# Altium footprint library ECU_AutoRC_r00.PcbLib: 62 footprints (part 3 of 4)
Each footprint in its own frame and in the unit in brackets; x right, y up, seen from the top. Pads: shape width x height; smd on the part's side, far side on the other; paste and mask are expansions set on the pad; w line width, h text height; cw(c..) or ccw(c..) is an arc to the next point about the centre after c.
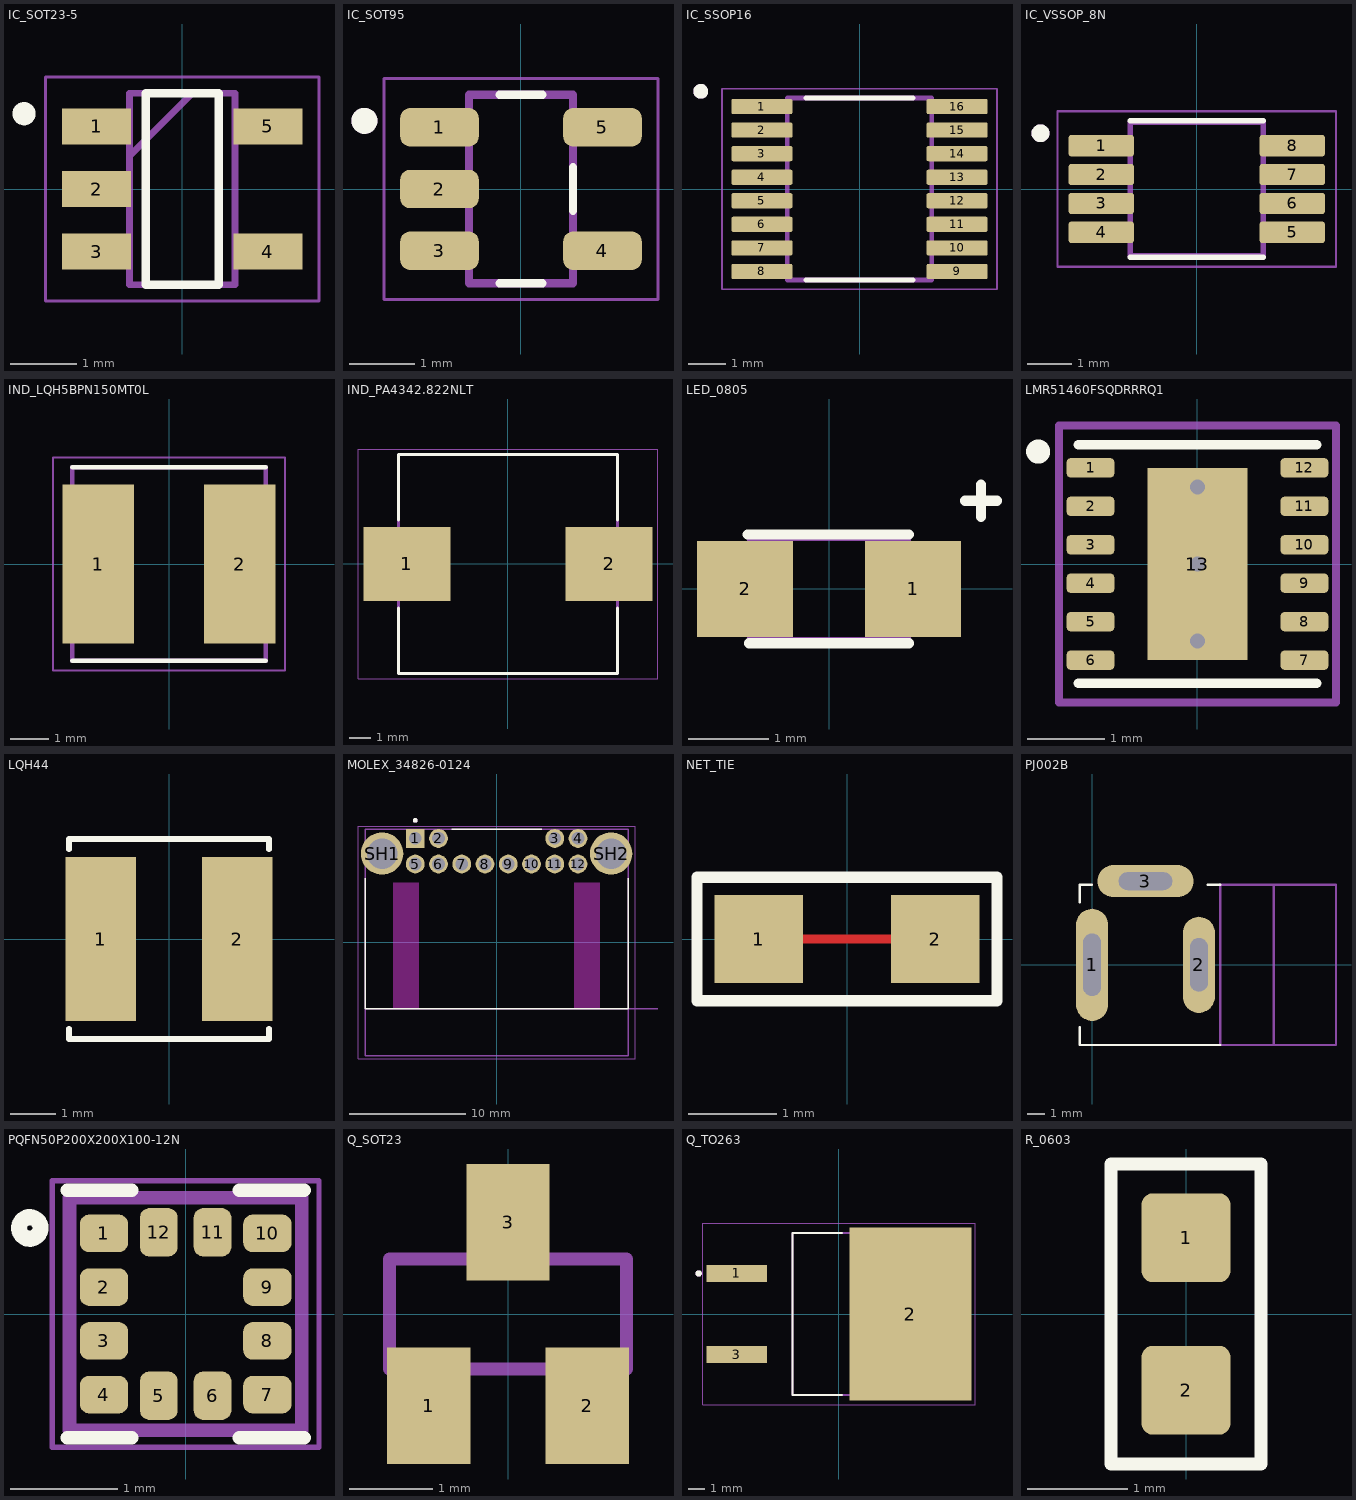
[diagram p2: the footprints below, top view; thin cyan lines are the x and y axes]

## IC_SOT23-5 [mm]
pads (5):
  rect 1.05x0.55 smd: 1(-1.3,0.95) 2(-1.3,0) 3(-1.3,-0.95) 4(1.3,-0.95) 5(1.3,0.95)
Top Overlay:
  circle w0.2: c-2.4,1.143 r0.076
  lines w0.127: -0.552,-1.45 0.552,-1.45 0.552,1.45 -0.552,1.45 -0.552,-1.45
Mechanical 13:
  lines w0.1: -0.8,0.5 0.15,1.45 ; -0.8,-1.45 0.8,-1.45 0.8,1.45 -0.8,1.45 -0.8,-1.45
Mechanical 15:
  lines w0.05: -2.075,-1.7 2.075,-1.7 2.075,1.7 -2.075,1.7 -2.075,-1.7
3D body "step_temp.STEP": height 1, standoff 0, extent -1.4,-1.45 1.4,1.45

## IC_SOT95 [mm]
pads (5):
  rrect50% 1.21x0.59 smd: 1(-1.255,0.95) 2(-1.255,0) 3(-1.255,-0.95) 4(1.255,-0.95) 5(1.255,0.95)
Top Overlay:
  circle w0.2: c-2.41,1.05 r0.1
  lines w0.127: -0.33,-1.45 0.33,-1.45 ; -0.33,1.45 0.33,1.45 ; 0.8,-0.335 0.8,0.335
Mechanical 13:
  circle w0.2: c-2.41,1.05 r0.1
  lines w0.127: -0.8,-1.45 0.8,-1.45 0.8,1.45 -0.8,1.45 -0.8,-1.45
Mechanical 15:
  lines w0.05: -2.11,-1.7 -2.11,1.7 2.11,1.7 2.11,-1.7 -2.11,-1.7
3D body "TPS72101DBVR.STEP": height 1.45, standoff 0, extent -1.4,-1.45 1.4,1.45

## IC_SSOP16 [mm]
pads (16):
  rrect25% 1.65x0.41 smd: 1(-2.63,2.222) 2(-2.63,1.587) 3(-2.63,0.953) 4(-2.63,0.318) 5(-2.63,-0.318) 6(-2.63,-0.953) 7(-2.63,-1.587) 8(-2.63,-2.222) 9(2.63,-2.222) 10(2.63,-1.587) 11(2.63,-0.953) 12(2.63,-0.318) 13(2.63,0.318) 14(2.63,0.953) 15(2.63,1.587) 16(2.63,2.222)
Top Overlay:
  circle w0.2: c-4.28,2.632 r0.1
  lines w0.127: -1.45,-2.452 1.45,-2.452 ; -1.45,2.452 1.45,2.452
Mechanical 13:
  circle w0.2: c-4.28,2.632 r0.1
  lines w0.127: -1.947,-2.452 1.947,-2.452 1.947,2.452 -1.947,2.452 -1.947,-2.452
Mechanical 15:
  lines w0.05: -3.705,-2.702 3.705,-2.702 3.705,2.702 -3.705,2.702 -3.705,-2.702
3D body "step_temp.STEP": height 1.75, standoff 0, extent -2.997,-2.451 2.997,2.451

## IC_VSSOP_8N [mm]
pads (8):
  rrect25% 1.47x0.48 smd: 1(-2.15,0.975) 2(-2.15,0.325) 3(-2.15,-0.325) 4(-2.15,-0.975) 5(2.15,-0.975) 6(2.15,-0.325) 7(2.15,0.325) 8(2.15,0.975)
Top Overlay:
  circle w0.2: c-3.52,1.255 r0.1
  lines w0.127: -1.5,-1.535 1.5,-1.535 ; -1.5,1.535 1.5,1.535
Mechanical 13:
  circle w0.2: c-3.52,1.255 r0.1
  lines w0.127: -1.5,-1.5 -1.5,1.5 1.5,1.5 1.5,-1.5 -1.5,-1.5
Mechanical 15:
  lines w0.05: -3.135,-1.75 -3.135,1.75 3.135,1.75 3.135,-1.75 -3.135,-1.75
3D body "LM3489MMX_NOPB.STEP": height 1.1, standoff 0, extent -2.45,-1.5 2.45,1.5

## IND_LQH5BPN150MT0L [mm]
pads (2):
  rect 1.85x4.1 smd: 1(-1.825,0) 2(1.825,0)
Top Overlay:
  lines w0.127: -2.5,-2.5 2.5,-2.5 ; -2.5,2.5 2.5,2.5
Mechanical 13:
  lines w0.127: -2.5,-2.5 2.5,-2.5 2.5,2.5 -2.5,2.5 -2.5,-2.5
Mechanical 15:
  lines w0.05: -3,-2.75 3,-2.75 3,2.75 -3,2.75 -3,-2.75
3D body "LQH5BPN150MT0L.STEP": height 2.2, standoff 0, extent -2.5,-2.5 2.5,2.5

## IND_PA4342.822NLT [mm]
height 4
pads (2):
  rect 4.1x3.5 smd: 1(-4.75,0) 2(4.75,0)
Top Overlay:
  lines w0.127: -5.15,-2.07 -5.15,-5.15 5.15,-5.15 5.15,-2.07 ; -5.15,2.07 -5.15,5.15 5.15,5.15 5.15,2.07
Mechanical 13:
  lines w0.127: -5.15,-5.15 5.15,-5.15 5.15,5.15 -5.15,5.15 -5.15,-5.15
Mechanical 15:
  lines w0.05: -7.05,-5.4 -7.05,5.4 7.05,5.4 7.05,-5.4 -7.05,-5.4
3D body "User Library-L-SMD_Pulse_electronic_PA4342_XXXNLT_series__Footprint1.STEP": height 4, standoff 0, extent -5.75,-5.15 5.75,5.15

## LED_0805 [mm]
pads (2):
  rect 1.2x1.2 smd: 1(1.05,0) 2(-1.05,0)
Top Overlay:
  lines w0.127: -1.02,0.68 1,0.68 ; -1,-0.68 1,-0.68 ; 1.7,1.1 2.1,1.1 ; 1.9,0.9 1.9,1.3
Mechanical 13:
  region: -0.8,-0.1 -1.003,-0.1 -1.003,0.1 -0.8,0.1
  lines w0.05: -1,-0.625 1,-0.625 1,0.625 -1,0.625 -1,-0.625
3D body "step_temp.STEP": height 1.1, standoff 0, extent -1,-0.625 1,0.625

## LMR51460FSQDRRRQ1 [mm]
pads (13):
  rrect40% 0.62x0.25 smd: 1(-1.39,1.25) 2(-1.39,0.75) 3(-1.39,0.25) 4(-1.39,-0.25) 5(-1.39,-0.75) 6(-1.39,-1.25) 7(1.39,-1.25) 8(1.39,-0.75) 9(1.39,-0.25) 10(1.39,0.25) 11(1.39,0.75) 12(1.39,1.25)
  rect 1.3x2.5 smd: 13(0,0)
via 0,-1 diameter 0.2 hole 0.2
via 0,0 diameter 0.2 hole 0.2
via 0,1 diameter 0.2 hole 0.2
Top Overlay:
  circle w0.254: c-2.07,1.46 r0.028
  lines w0.127: -1.55,-1.55 1.55,-1.55 ; -1.55,1.55 1.55,1.55
Mechanical 15:
  lines w0.1: -1.8,-1.8 1.8,-1.8 1.8,1.8 -1.8,1.8 -1.8,-1.8
3D body "LMR51460FSQDRRRQ1--3DModel-STEP-56544.STEP": height 0.8, standoff 0, extent -1.5,-1.5 1.5,1.5

## LQH44 [mm]
pads (2):
  rect 1.55x3.6 smd: 1(-1.5,0) 2(1.5,0)
Top Overlay:
  lines w0.127: -2.2,-1.975 -2.2,-2.2 2.2,-2.2 2.2,-1.975 ; -2.2,1.975 -2.2,2.2 2.2,2.2 2.2,1.975
3D body "IND_BOURNS_SRN4018.step": height 1.8, standoff 0, extent -2.096,-2.098 2.096,2.098

## MOLEX_34826-0124 [mm]
height 12.25
pads (14):
  rect 1.62x1.62 / inner round 1.62 / far side rect 1.62x1.62 hole 1.08: 1(-7,8.95)
  round 1.62 hole 1.08: 2(-5,8.95) 3(5,8.95) 4(7,8.95) 5(-7,6.75) 6(-5,6.75) 7(-3,6.75) 8(-1,6.75) 9(1,6.75) 10(3,6.75) 11(5,6.75) 12(7,6.75)
  round 3.646 hole 2.63: SH1(-9.85,7.65) SH2(9.85,7.65)
Top Overlay:
  circle w0.2: c-7,10.5 r0.1
  lines w0.127: -11.315,5.507 -11.315,-5.7 11.315,-5.7 11.315,5.507 ; -3.87,9.75 3.87,9.75
Keep-Out Layer:
  region: 8.89,-5.7 6.69,-5.7 6.69,5.15 8.89,5.15
  region: -6.69,-5.7 -8.89,-5.7 -8.89,5.15 -6.69,5.15
Mechanical 13:
  circle w0.2: c-7,10.5 r0.1
  lines w0.127: 13.88,-5.7 -11.315,-5.7 ; -11.315,-5.7 -11.315,9.75 11.315,9.75 11.315,-9.75 -11.315,-9.75 -11.315,-5.7
  text "PCB Edge" at 12.25,-5.5 h1.02
Mechanical 15:
  lines w0.05: -11.923,-10 11.923,-10 11.923,10.01 -11.923,10.01 -11.923,-10
3D body "0348260124.stp": height 12.14, standoff -3.74, extent -11.314,-9.731 11.314,9.769

## NET_TIE [mm]
pads (2):
  rect 1x1 smd mask+0.01: 1(-1,0) 2(1,0)
Top Layer:
  rectangle: -0.9,-0.05 0.9,0.05
Top Overlay:
  lines w0.127: -1.7,-0.7 1.7,-0.7 1.7,0.7 -1.7,0.7 -1.7,-0.7

## PJ002B [mm]
pads (3):
  oval 1.8x6.3 hole 1 slot 3.5 at 90 deg: 1(0,0)
  oval 1.8x5.4 hole 1 slot 3 at 90 deg: 2(6,0)
  oval 5.4x1.8 hole 1 slot 3 at 0 deg: 3(3,4.7)
Top Overlay:
  lines w0.127: -0.7,-3.5 -0.7,-4.5 7.2,-4.5 ; -0.7,3.5 -0.7,4.5 0,4.5 ; 6.5,4.5 7.2,4.5
Mechanical 4:
  lines w0.127: 10.2,-4.5 10.2,4.5 ; 7.2,-4.5 7.2,4.5 13.7,4.5 13.7,-4.5 7.2,-4.5
3D body "User Library-PJ-002AH.STEP": height 11.05, standoff -3.45, extent -0.7,-4.7 13.7,4.7

## PQFN50P200X200X100-12N [mm]
pads (12):
  rrect50% 0.45x0.35 smd mask+0.08: 1(-0.76,0.75) 2(-0.76,0.25) 3(-0.76,-0.25) 4(-0.76,-0.75) 7(0.76,-0.75) 8(0.76,-0.25) 9(0.76,0.25) 10(0.76,0.75)
  rrect50% 0.35x0.45 smd mask+0.08: 5(-0.25,-0.76) 6(0.25,-0.76) 11(0.25,0.76) 12(-0.25,0.76)
Top Overlay:
  circle w0.15: c-1.45,0.8 r0.1
  lines w0.127: -1.1,-1.15 -0.5,-1.15 ; -1.1,1.15 -0.5,1.15 ; 0.5,-1.15 1.1,-1.15 ; 0.5,1.15 1.1,1.15
Mechanical 13:
  lines w0.127: -1.08,-1.08 1.08,-1.08 1.08,1.08 -1.08,1.08 -1.08,-1.08
Mechanical 15:
  lines w0.05: -1.24,-1.24 1.24,-1.24 1.24,1.24 -1.24,1.24 -1.24,-1.24
3D body "LIS2HH12TR.STEP": height 1, standoff 0, extent -1,-1 1,1

## Q_SOT23 [mm]
pads (3):
  rect 1x1.4 smd: 1(-0.95,-1.1) 2(0.95,-1.1) 3(0,1.1)
Mechanical 13:
  region: -0.711,-1.297 -1.17,-1.297 -1.17,-0.711 -0.711,-0.711
  region: 1.168,-1.297 0.712,-1.297 0.712,-0.711 1.168,-0.711
  region: 0.229,0.711 -0.229,0.711 -0.229,1.295 0.229,1.295
  lines w0.152: -1.422,-0.66 -1.422,0.66 1.422,0.66 1.422,-0.66 -1.422,-0.66
3D body "step_temp.STEP": height 1.1, standoff 0, extent -1.45,-1.15 1.45,1.15

## Q_TO263 [mm]
pads (3):
  rect 3.79x1.06 smd: 1(-6.4,2.54) 3(-6.4,-2.54)
  rect 7.62x10.84 smd paste-6: 2(4.48,0)
Top Overlay:
  circle w0.2: c-8.79,2.54 r0.1
  lines w0.127: 0.2,-5.08 -2.915,-5.08 -2.915,5.08 0.2,5.08
Top Paste:
  region: 7.745,-5.13 6.295,-5.13 6.295,-3.87 7.745,-3.87
  region: 7.745,-3.33 6.295,-3.33 6.295,-2.07 7.745,-2.07
  region: 7.745,-1.53 6.295,-1.53 6.295,-0.27 7.745,-0.27
  region: 7.745,0.27 6.295,0.27 6.295,1.53 7.745,1.53
  region: 7.745,2.07 6.295,2.07 6.295,3.33 7.745,3.33
  region: 7.745,3.87 6.295,3.87 6.295,5.13 7.745,5.13
  region: 2.665,-5.13 1.215,-5.13 1.215,-3.87 2.665,-3.87
  region: 2.665,-3.33 1.215,-3.33 1.215,-2.07 2.665,-2.07
  region: 2.665,-1.53 1.215,-1.53 1.215,-0.27 2.665,-0.27
  region: 2.665,0.27 1.215,0.27 1.215,1.53 2.665,1.53
  region: 2.665,2.07 1.215,2.07 1.215,3.33 2.665,3.33
  region: 2.665,3.87 1.215,3.87 1.215,5.13 2.665,5.13
  region: 5.205,-5.13 3.755,-5.13 3.755,-3.87 5.205,-3.87
  region: 5.205,-3.33 3.755,-3.33 3.755,-2.07 5.205,-2.07
  region: 5.205,3.87 3.755,3.87 3.755,5.13 5.205,5.13
  region: 5.205,2.07 3.755,2.07 3.755,3.33 5.205,3.33
  region: 5.205,-1.53 3.755,-1.53 3.755,-0.27 5.205,-0.27
  region: 5.205,0.27 3.755,0.27 3.755,1.53 5.205,1.53
Mechanical 13:
  circle w0.2: c-8.79,2.54 r0.1
  lines w0.127: -2.915,-5.08 6.1,-5.08 6.1,5.08 -2.915,5.08 -2.915,-5.08
Mechanical 15:
  lines w0.05: -8.54,-5.67 8.54,-5.67 8.54,5.67 -8.54,5.67 -8.54,-5.67
3D body "FDB3632.STEP": height 5.03, standoff -0.01, extent -7.622,-5.15 7.622,5.01

## R_0603 [mil]
pads (2):
  rrect25% 35x35 smd: 1(0,30) 2(0,-30)
Top Overlay:
  lines w5: -29.53,-59.06 29.53,-59.06 29.53,59.06 -29.53,59.06 -29.53,-59.06
3D body "step_temp.STEP": height 21.65, standoff 0, extent -15.75,-31.5 15.75,31.5